# Altium footprint library mastermind.PCBLIB: 1061 footprints (part 20 of 67)
Each footprint in its own frame and in the unit in brackets; x right, y up, seen from the top. Pads: shape width x height; smd on the part's side, far side on the other; paste and mask are expansions set on the pad; w line width, h text height; cw(c..) or ccw(c..) is an arc to the next point about the centre after c.
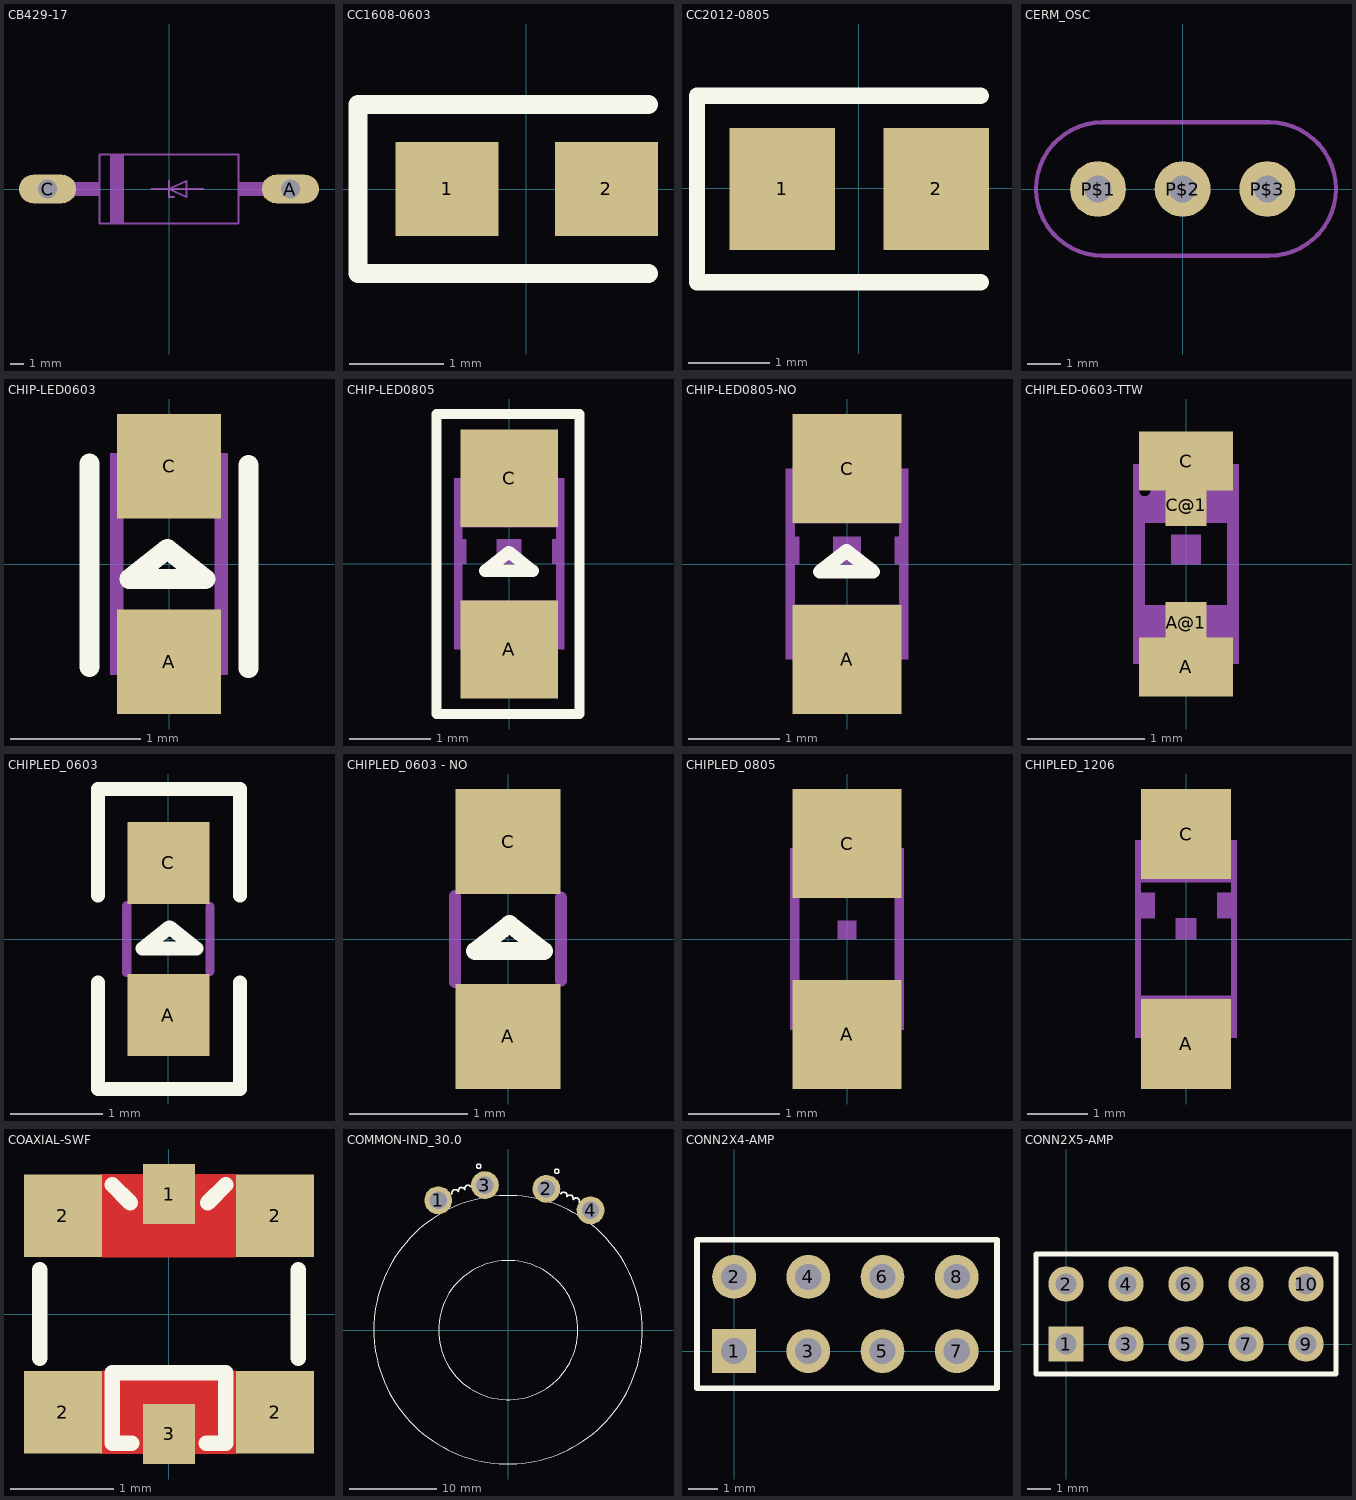
[diagram p19: the footprints below, top view; thin cyan lines are the x and y axes]

## CB429-17 [mil]
pads (2):
  oval 165x82.5 hole 55: A(350,0) C(-350,0)
Mechanical 2:
  region: -285,-20 -285,20 -200,20 -200,-20
  region: 200,-20 200,20 285,20 285,-20
  region: -170,-100 -170,100 -130,100 -130,-100
  lines w6: -50,0 0,0 ; 0,23 0,0 ; 15,-23 0,-23 0,0 ; 100,0 0,0 ; 0,0 50,-23 50,23 0,0 ; -200,-100 200,-100 200,100 -200,100 -200,-100
Mechanical 8:
  lines w40: -350,0 -290,0 ; 290,0 350,0

## CC1608-0603 [mm]
pads (2):
  rect 1.1x1 smd: 1(-0.843,0.001) 2(0.857,0.001)
Top Overlay:
  lines w0.2: 1.307,-0.899 -1.793,-0.899 -1.793,0.901 1.307,0.901
3D body: height 0.76, standoff 0, extent -1.46,-0.572 1.46,0.572

## CC2012-0805 [mm]
pads (2):
  rect 1.3x1.5 smd: 1(-0.945,-0.007) 2(0.955,-0.007)
Top Overlay:
  lines w0.2: 1.505,-1.157 -1.995,-1.157 -1.995,1.143 1.505,1.143
3D body: height 0.76, standoff 0, extent -1.524,-0.699 1.524,0.699

## CERM_OSC [mil]
pads (3):
  round 66 hole 32: P$1(-100,0) P$2(0,0) P$3(100,0)
Mechanical 2:
  lines w5: -94.49,-78.74 cw(c-94.49,0) -94.49,78.74 102.36,78.74 cw(c102.36,0) 102.36,-78.74 -94.49,-78.74

## CHIP-LED0603 [mil]
pads (2):
  rect 31.5x31.5 smd: A(0,-29.53) C(0,29.53)
Top Overlay:
  lines w5.98: -24.02,-31.1 -24.02,30.32 ; 24.02,-31.5 24.02,29.92
  lines w6: -12,-4.5 11,-4.5 -0.5,4.5 -12,-4.5
Mechanical 8:
  region: -17.72,17.72 -17.72,33.46 17.72,33.46 17.72,17.72
  region: -17.72,-33.46 -17.72,-17.72 17.72,-17.72 17.72,-33.46
  lines w4: -15.75,-17.72 -15.75,17.72 ; 15.75,-17.72 15.75,17.72
3D body "led 3d model.STEP": height 21.65, standoff 0, extent -16.71,-32 14.78,31

## CHIP-LED0805 [mm]
pads (2):
  rect 1.2x1.2 smd: A(0,-1.05) C(0,1.05)
Top Overlay:
  lines w0.127: -0.893,-1.841 0.863,-1.841 0.863,1.838 -0.893,1.838 -0.893,-1.841
  lines w0.152: -0.297,-0.085 -0.005,0.144 0.287,-0.085 -0.297,-0.085
Mechanical 2:
  region: -0.675,0 -0.675,0.3 -0.525,0.3 -0.525,0
  region: 0.525,0 0.525,0.3 0.675,0.3 0.675,0
  region: -0.15,0 -0.15,0.3 0.15,0.3 0.15,0
Mechanical 8:
  region: -0.675,0.45 -0.675,1.05 0.675,1.05 0.675,0.45
  region: -0.675,-1.05 -0.675,-0.45 0.675,-0.45 0.675,-1.05
  lines w0.102: -0.625,-0.45 -0.625,0.45 ; 0.625,-0.475 0.625,0.45
3D body "0805 Chip SMD LED (2x1.2mm).STEP": height 0.8, standoff 0, extent -0.625,-1 0.625,1

## CHIP-LED0805-NO [mm]
pads (2):
  rect 1.2x1.2 smd: A(0,-1.05) C(0,1.05)
Top Overlay:
  lines w0.152: -0.297,-0.085 0.287,-0.085 -0.005,0.144 -0.297,-0.085
Mechanical 2:
  region: -0.15,0 -0.15,0.3 0.15,0.3 0.15,0
  region: 0.525,0 0.525,0.3 0.675,0.3 0.675,0
  region: -0.675,0 -0.675,0.3 -0.525,0.3 -0.525,0
Mechanical 8:
  region: -0.675,-1.05 -0.675,-0.45 0.675,-0.45 0.675,-1.05
  region: -0.675,0.45 -0.675,1.05 0.675,1.05 0.675,0.45
  lines w0.102: -0.625,-0.45 -0.625,0.45 ; 0.625,-0.475 0.625,0.45
3D body "0805 Chip SMD LED (2x1.2mm).STEP": height 0.8, standoff 0, extent -0.625,-1 0.625,1

## CHIPLED-0603-TTW [mm]
pads (4):
  rect 0.8x0.5 smd paste-0.4 mask-0.4: A(0,-0.875) C(0,0.875)
  rect 0.35x0.35 smd: A@1(0,-0.5) C@1(0,0.5)
Top Solder:
  region: -0.175,-0.675 -0.175,-0.325 0.175,-0.325 0.175,-0.675
  region: -0.4,-1.125 -0.4,-0.625 0.4,-0.625 0.4,-1.125
  region: -0.4,0.625 -0.4,1.125 0.4,1.125 0.4,0.625
  region: -0.175,0.325 -0.175,0.7 0.175,0.7 0.175,0.325
Mechanical 2:
  region: -0.125,0 -0.125,0.25 0.125,0.25 0.125,0
Mechanical 8:
  circle w0.051: c-0.35,0.625 r0.075
  region: 0.175,-0.65 0.175,-0.55 0.275,-0.55 0.275,-0.65
  region: -0.275,-0.65 -0.275,-0.55 -0.175,-0.55 -0.175,-0.65
  region: -0.275,-0.575 -0.275,-0.35 0.275,-0.35 0.275,-0.575
  region: 0.25,-0.85 0.25,-0.35 0.45,-0.35 0.45,-0.85
  region: -0.45,-0.85 -0.45,-0.35 -0.25,-0.35 -0.25,-0.85
  region: -0.45,0.35 -0.45,0.575 0.45,0.575 0.45,0.35
  region: 0.25,0.55 0.25,0.85 0.45,0.85 0.45,0.55
  region: -0.45,0.35 -0.45,0.725 -0.4,0.725 -0.4,0.35
  region: -0.275,0.55 -0.275,0.6 -0.225,0.6 -0.225,0.55
  region: -0.45,0.7 -0.45,0.85 -0.25,0.85 -0.25,0.7
  lines w0.051: -0.275,-0.825 cw(c0,-0.825) 0.275,-0.825
  lines w0.102: -0.4,-0.35 -0.4,0.375 ; -0.3,0.825 ccw(c0,0.825) 0.3,0.825 ; 0.4,-0.35 0.4,0.35

## CHIPLED_0603 [mil]
pads (2):
  rect 35x35 smd: A(0,-32.5) C(0,32.5)
Top Overlay:
  lines w5.98: -30,-18.5 -30,-64 30.5,-64 30.5,-18.5 ; -30,18.5 -30,64 30.5,64 30.5,18.5
  lines w6: -11,-4 0.5,5 12,-4 -11,-4
Mechanical 8:
  lines w4: -17.75,-14.28 -17.75,14.26 ; 17.75,-13.78 17.75,13.78
3D body "led 3d model.STEP": height 21.65, standoff 0, extent -15.71,-31.5 15.78,31.5

## CHIPLED_0603 - NO [mil]
pads (2):
  rect 35x35 smd: A(0,-32.5) C(0,32.5)
Top Overlay:
  lines w6: -11,-4 0.5,5 12,-4 -11,-4
Mechanical 8:
  lines w4: -17.75,-14.28 -17.75,14.26 ; 17.75,-13.78 17.75,13.78
3D body "led 3d model.STEP": height 21.65, standoff 0, extent -15.71,-31.5 15.78,31.5

## CHIPLED_0805 [mm]
pads (2):
  rect 1.2x1.2 smd: A(0,-1.05) C(0,1.05)
Mechanical 2:
  region: -0.1,0 -0.1,0.2 0.1,0.2 0.1,0
Mechanical 8:
  circle w0.102: c-0.45,0.85 r0.103
  region: 0.3,0.5 0.3,1 0.625,1 0.625,0.5
  region: -0.325,0.5 -0.325,0.75 -0.175,0.75 -0.175,0.5
  region: 0.175,0.5 0.175,0.75 0.325,0.75 0.325,0.5
  region: -0.2,0.5 -0.2,0.675 0.2,0.675 0.2,0.5
  region: 0.3,-1 0.3,-0.5 0.625,-0.5 0.625,-1
  region: -0.625,-1 -0.625,-0.5 -0.3,-0.5 -0.3,-1
  region: 0.175,-0.75 0.175,-0.5 0.325,-0.5 0.325,-0.75
  region: -0.325,-0.75 -0.325,-0.5 -0.175,-0.5 -0.175,-0.75
  region: -0.2,-0.675 -0.2,-0.5 0.2,-0.5 0.2,-0.675
  region: -0.6,0.5 -0.6,0.8 -0.3,0.8 -0.3,0.5
  region: -0.625,0.925 -0.625,1 -0.4,1 -0.4,0.925
  lines w0.102: -0.575,-0.5 -0.575,0.925 ; -0.35,-1 cw(c0,-1) 0.35,-1 ; -0.35,1 ccw(c0,1) 0.35,1 ; 0.575,-0.525 0.575,0.525

## CHIPLED_1206 [mm]
pads (2):
  rect 1.5x1.5 smd: A(0,-1.75) C(0,1.75)
Mechanical 2:
  region: -0.85,0.35 -0.85,0.775 -0.525,0.775 -0.525,0.35
  region: 0.525,0.35 0.525,0.775 0.85,0.775 0.85,0.35
  region: -0.175,0 -0.175,0.35 0.175,0.35 0.175,0
Mechanical 8:
  circle w0.102: c-0.55,1.425 r0.1
  region: -0.85,1.525 -0.85,1.65 -0.35,1.65 -0.35,1.525
  region: -0.85,1.225 -0.85,1.55 -0.625,1.55 -0.625,1.225
  region: -0.45,1.225 -0.45,1.45 -0.325,1.45 -0.325,1.225
  region: -0.65,1.225 -0.65,1.35 -0.225,1.35 -0.225,1.225
  region: 0.35,1.3 0.35,1.65 0.85,1.65 0.85,1.3
  region: 0.25,1.225 0.25,1.35 0.85,1.35 0.85,1.225
  region: -0.85,0.95 -0.85,1.25 0.85,1.25 0.85,0.95
  region: -0.85,-1.65 -0.85,-0.95 0.85,-0.95 0.85,-1.65
  lines w0.102: -0.8,-0.95 -0.8,0.95 ; -0.4,1.625 ccw(c0,1.625) 0.4,1.625 ; 0.8,-0.95 0.8,0.95

## COAXIAL-SWF [mm]
pads (6):
  rect 0.5x0.58 smd: 1(0,1.16) 3(0,-1.16)
  rect 0.75x0.8 smd: 2(-1.025,-0.95) 2(-1.025,0.95) 2(1.025,-0.95) 2(1.025,0.95)
Top Layer:
  pour cut-out: 0.65,-0.55 -0.65,-0.55 -0.65,-1.35 0.65,-1.35
  pour cut-out: -0.65,0.55 0.65,0.55 0.65,1.35 -0.65,1.35
Top Overlay:
  lines w0.15: -1.25,-0.43 -1.25,0.43 ; -0.55,1.25 -0.375,1.075 ; -0.36,-1.25 -0.55,-1.25 -0.55,-0.57 0.55,-0.57 0.55,-1.25 0.36,-1.25 ; 0.375,1.075 0.55,1.25 ; 1.25,-0.43 1.25,0.43

## COMMON-IND_30.0 [mm]
pads (4):
  round 3.2 hole 2: 1(-8.04,14.92) 2(4.389,16.23) 3(-2.677,16.666) 4(9.46,13.76)
Top Overlay:
  circle w0.154: c-3.39,18.84 r0.25
  circle w0.1: c-0.022,0.042 r15.421
  circle w0.1: c0,0 r8
  circle w0.154: c5.58,18.25 r0.25
  lines w0.154: -6.448,15.636 cw(c-6.088,15.76) -5.728,15.884 ; -5.704,15.892 cw(c-5.343,16.016) -4.983,16.14 ; -4.959,16.148 cw(c-4.599,16.272) -4.239,16.396 ; 6.031,15.639 cw(c6.377,15.478) 6.722,15.317 ; 6.745,15.306 cw(c7.09,15.145) 7.436,14.984 ; 7.459,14.973 cw(c7.804,14.812) 8.149,14.651
3D body "Regulator Coil.STEP": height 18, standoff 4, extent -15.047,-14.999 14.953,15.001

## CONN2X4-AMP [mm] "Connector; Header; 5x2 Position"
height 1.4
pads (8):
  rect 1.5x1.5 hole 0.9: 1(0,0)
  round 1.5 hole 0.9: 2(0,2.54) 3(2.54,0) 4(2.54,2.54) 5(5.08,0) 6(5.08,2.54) 7(7.62,0) 8(7.62,2.54)
Top Overlay:
  lines w0.2: -1.27,-1.27 -1.27,3.81 9,3.81 9,-1.27 -1.27,-1.27
3D body "825440-4.step": height 9.7, standoff -3, extent -1.2,-2.29 8.96,3.86

## CONN2X5-AMP [mm] "Connector; Header; 5x2 Position"
height 1.4
pads (10):
  rect 1.5x1.5 hole 0.9: 1(0,0)
  round 1.5 hole 0.9: 2(0,2.54) 3(2.54,0) 4(2.54,2.54) 5(5.08,0) 6(5.08,2.54) 7(7.62,0) 8(7.62,2.54) 9(10.16,0) 10(10.16,2.54)
Top Overlay:
  lines w0.2: -1.27,-1.27 11.43,-1.27 11.43,3.81 -1.27,3.81 -1.27,-1.27
3D body "825440-5.step": height 9.7, standoff -3, extent -1.27,-2.45 11.43,3.7